# Altium footprint library XU-GENARAL PCB .PcbLib: 1176 footprints (part 39 of 75)
Each footprint in its own frame and in the unit in brackets; x right, y up, seen from the top. Pads: shape width x height; smd on the part's side, far side on the other; paste and mask are expansions set on the pad; w line width, h text height; cw(c..) or ccw(c..) is an arc to the next point about the centre after c.
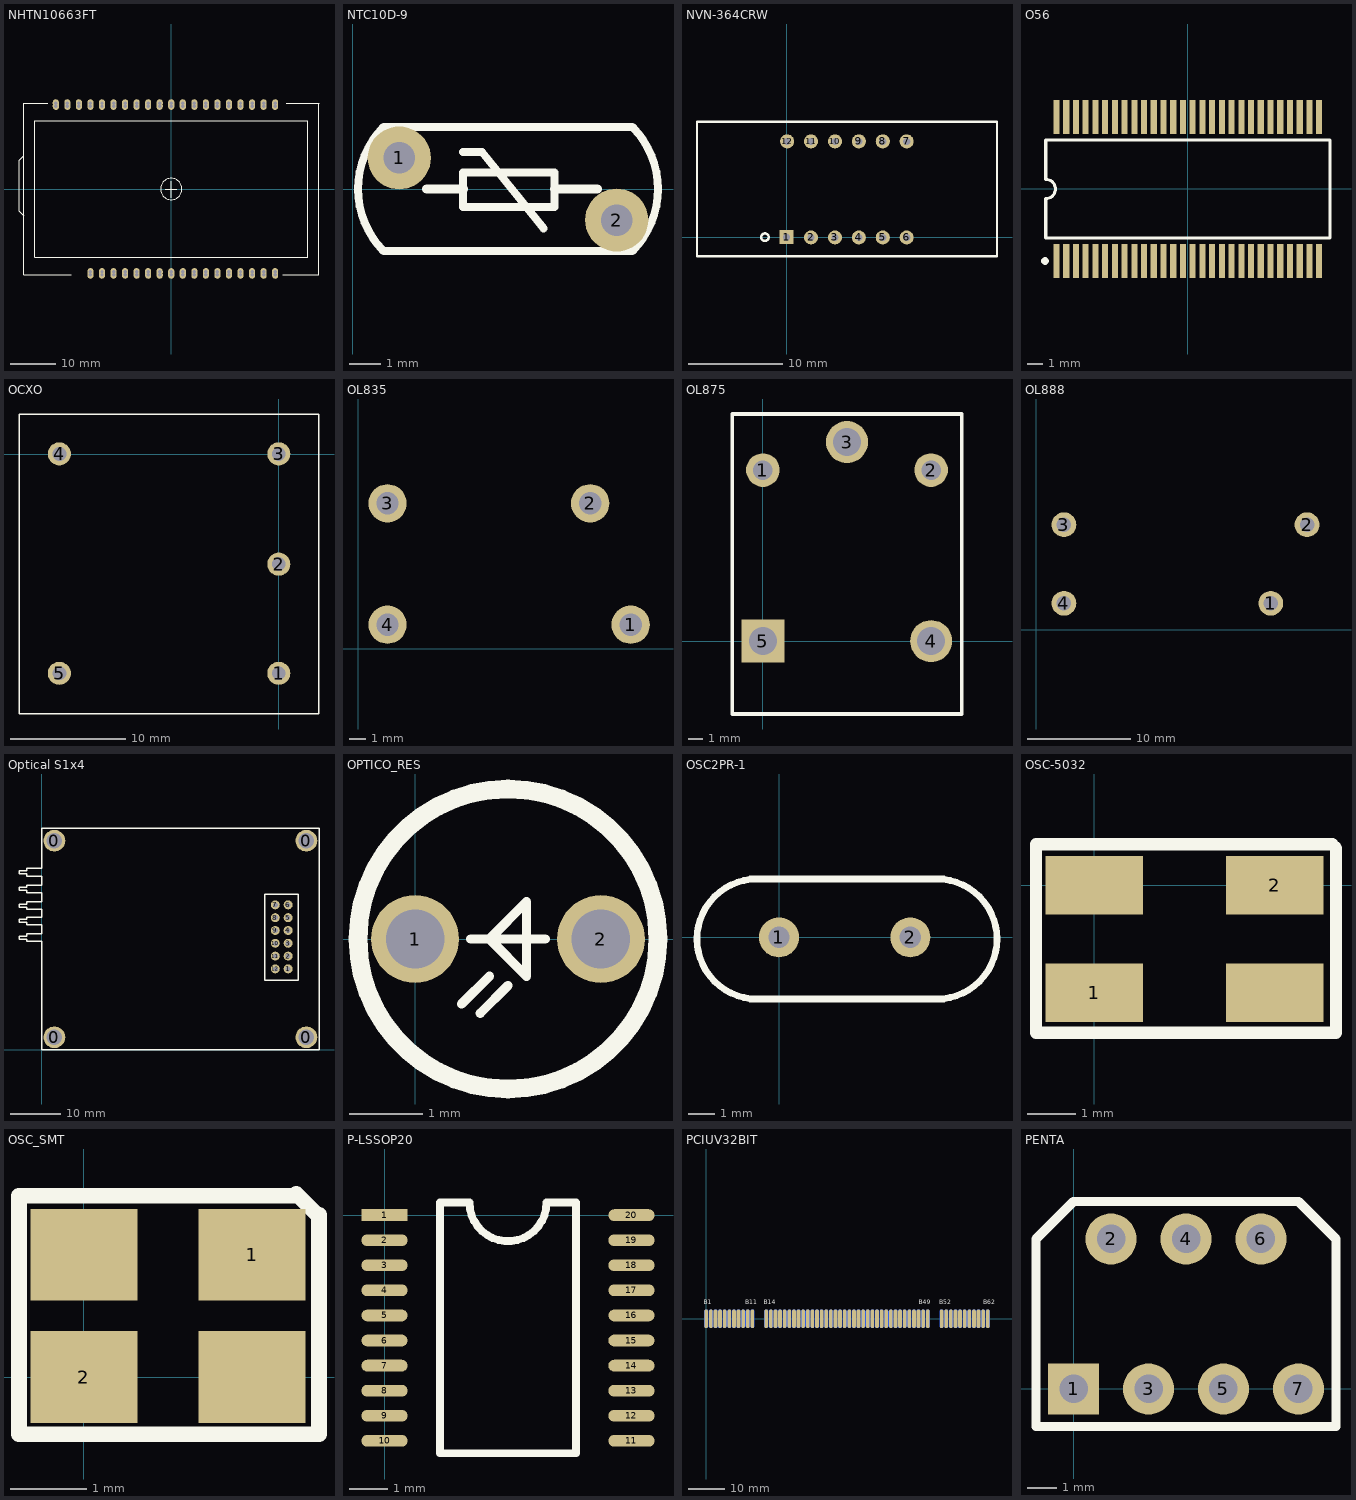
[diagram p38: the footprints below, top view; thin cyan lines are the x and y axes]

## NHTN10663FT [mm]
pads (74):
  oval 1.35x1.7 hole 0.762: 0(-25.4,18.25) 0(-25.4,18.9) 1(-22.86,18.25) 1(-22.86,18.9) 2(-20.32,18.25) 2(-20.32,18.9) 3(-17.78,18.25) 3(-17.78,18.9) 4(-15.24,18.25) 4(-15.24,18.9) 5(-12.7,18.25) 5(-12.7,18.9) 6(-10.16,18.25) 6(-10.16,18.9) 7(-7.62,18.25) 7(-7.62,18.9) 8(-5.08,18.25) 8(-5.08,18.9) 9(-2.54,18.25) 9(-2.54,18.9) 10(0,18.25) 10(0,18.9) 11(2.54,18.25) 11(2.54,18.9) 12(5.08,18.25) 12(5.08,18.9) 13(7.62,18.25) 13(7.62,18.9) 14(10.16,18.25) 14(10.16,18.9) 15(12.7,18.25) 15(12.7,18.9) 16(15.24,18.25) 16(15.24,18.9) 17(17.78,18.25) 17(17.78,18.9) 18(20.32,18.25) 18(20.32,18.9) 19(22.86,18.25) 19(22.86,18.9) 20(22.86,-18.9) 20(22.86,-18.25) 21(20.32,-18.9) 21(20.32,-18.25) 22(17.78,-18.9) 22(17.78,-18.25) 23(15.24,-18.9) 23(15.24,-18.25) 24(12.7,-18.9) 24(12.7,-18.25) 25(10.16,-18.9) 25(10.16,-18.25) 26(7.62,-18.9) 26(7.62,-18.25) 27(5.08,-18.9) 27(5.08,-18.25) 28(2.54,-18.9) 28(2.54,-18.25) 29(0,-18.9) 29(0,-18.25) 30(-2.54,-18.9) 30(-2.54,-18.25) 31(-5.08,-18.9) 31(-5.08,-18.25) 32(-7.62,-18.9) 32(-7.62,-18.25) 33(-10.16,-18.9) 33(-10.16,-18.25) 34(-12.7,-18.9) 34(-12.7,-18.25) 35(-15.24,-18.9) 35(-15.24,-18.25) 36(-17.78,-18.9) 36(-17.78,-18.25)
Top Overlay:
  circle w0.203: c0,0 r2.357
  lines w0.127: -30,-15 -30,15 30,15 30,-15 -30,-15
  lines w0.203: -32.5,-5.888 -33.5,-4.888 -33.5,6.288 -32.5,7.288 ; -27.13,18.9 -32.5,18.9 -32.5,-18.9 -22,-18.9 ; -1.286,0 1.254,0 ; 0,-1.874 0,1.666 ; 24.5,-18.9 32.5,-18.9 32.5,18.9 ; 25.25,18.9 32.51,18.9

## NTC10D-9 [mil]
pads (2):
  round 80 hole 40: 1(59.06,39.37) 2(334.65,-39.37)
Top Overlay:
  lines w10: 140,47 164,47 242,-50 ; 39.37,-78.74 cw(c118.11,0) 39.37,78.74 354.33,78.74 cw(c275.59,0) 354.33,-78.74 39.37,-78.74 ; 140,-23 256,-23 256,21 140,21 140,-23
  lines w12: 94,0 140,0 ; 256,0 310,0

## NVN-364CRW [mm]
pads (12):
  rect 1.5x1.5 hole 0.762: 1(0,0)
  round 1.5 hole 0.762: 2(2.594,-0.025) 3(5.134,-0.025) 4(7.674,-0.025) 5(10.214,-0.025) 6(12.754,-0.025) 7(12.754,10.18) 8(10.214,10.18) 9(7.674,10.18) 10(5.134,10.18) 11(2.594,10.18) 12(0.054,10.18)
Top Overlay:
  circle w0.254: c-2.307,0 r0.402
  lines w0.254: -9.525,-2.032 22.352,-2.032 22.352,12.269 -9.525,12.269 -9.525,-2.032

## O56 [mm] "SSOP; 56 Leads; Body Width 7.5 mm; Pitch 0.635 mm"
height 2.8
pads (56):
  rect 0.4x2.2 smd: 1(-8.572,-4.7) 2(-7.938,-4.7) 3(-7.302,-4.7) 4(-6.667,-4.7) 5(-6.032,-4.7) 6(-5.397,-4.7) 7(-4.763,-4.7) 8(-4.127,-4.7) 9(-3.492,-4.7) 10(-2.857,-4.7) 11(-2.222,-4.7) 12(-1.587,-4.7) 13(-0.953,-4.7) 14(-0.318,-4.7) 15(0.318,-4.7) 16(0.953,-4.7) 17(1.587,-4.7) 18(2.222,-4.7) 19(2.857,-4.7) 20(3.492,-4.7) 21(4.127,-4.7) 22(4.763,-4.7) 23(5.397,-4.7) 24(6.032,-4.7) 25(6.667,-4.7) 26(7.302,-4.7) 27(7.938,-4.7) 28(8.572,-4.7) 29(8.572,4.7) 30(7.938,4.7) 31(7.302,4.7) 32(6.667,4.7) 33(6.032,4.7) 34(5.397,4.7) 35(4.763,4.7) 36(4.127,4.7) 37(3.492,4.7) 38(2.857,4.7) 39(2.222,4.7) 40(1.587,4.7) 41(0.953,4.7) 42(0.318,4.7) 43(-0.318,4.7) 44(-0.953,4.7) 45(-1.587,4.7) 46(-2.222,4.7) 47(-2.857,4.7) 48(-3.492,4.7) 49(-4.127,4.7) 50(-4.763,4.7) 51(-5.397,4.7) 52(-6.032,4.7) 53(-6.667,4.7) 54(-7.302,4.7) 55(-7.938,4.7) 56(-8.572,4.7)
Top Overlay:
  circle w0.25: c-9.323,-4.7 r0.125
  lines w0.2: -9.275,-3.2 9.275,-3.2 9.275,3.2 -9.275,3.2 -9.275,0.635 cw(c-9.275,0) -9.275,-0.635 -9.275,-3.2

## OCXO [mm]
pads (5):
  round 2 hole 1.2: 1(0,-19) 2(0,-9.525) 3(0,0.05) 4(-19.05,0.05) 5(-19.05,-19)
Top Overlay:
  lines w0.127: -22.554,-21.506 -22.554,3.494 ; -22.549,-22.519 -22.549,-21.519 ; -22.514,3.477 2.486,3.477 ; -22.512,-22.517 3.488,-22.517 ; 2.482,3.477 3.482,3.477 ; 3.493,-22.514 3.493,3.486

## OL835 [mm]
pads (4):
  round 2.4 hole 1.4: 1(17.09,1.5) 2(14.55,9.1) 3(1.85,9.1) 4(1.85,1.5)
Bottom Overlay:
  lines w0.254: 18.796,0 18.796,10.6 ; 18.8,0 0,0 0,10.6 18.8,10.6

## OL875 [mm]
pads (5):
  round 2.4 hole 1.4: 1(0,12.2) 2(12,12.2)
  round 3 hole 2: 3(6,14.2) 4(12,0)
  rect 3.048x3.048 hole 2: 5(0,0)
Top Overlay:
  lines w0.254: -2.2,-5.2 -2.2,16.2 14.2,16.2 14.2,-5.2 -2.2,-5.2

## OL888 [mm]
pads (4):
  round 2.4 hole 1.4: 1(22.7,2.55) 2(26.2,10.15) 3(2.7,10.15) 4(2.7,2.55)
Bottom Overlay:
  lines w0.254: 0,0 0,12.7 29,12.7 29,0 0,0

## Optical S1x4 [mil]
height 267.72
pads (16):
  round 170 hole 120: 0(98.42,98.43) 0(98.42,1633.86) 0(2066.93,98.43) 0(2066.93,1633.86)
  round 70 hole 39.37: 1(1924.02,632.64) 2(1924.02,732.64) 3(1924.02,832.64) 4(1924.02,932.64) 5(1924.02,1032.64) 6(1924.02,1132.64) 7(1824.02,1132.64) 8(1824.02,1032.64) 9(1824.02,932.64) 10(1824.02,832.64) 11(1824.02,732.64) 12(1824.02,632.64)
Top Overlay:
  lines w10: 1760,545 2005,545 2005,1215 1740,1215 1740,545 1945,545 ; -178.11,865.32 -118.11,865.32 -118.11,847.24 0,847.24 0,0 2165.35,0 2165.35,1732.28 0,1732.28 0,1417.28 -118.11,1417.28 -118.11,1399.13 -178.11,1399.13 -178.11,1375.36 -118.11,1375.36 -118.11,1357.28 0,1357.28 0,1287.28 -118.11,1287.28 -118.11,1269.13 -178.11,1269.13 -178.11,1245.36 -118.11,1245.36 -118.11,1240.84 -118.11,1238.58 -118.11,1234.06 -118.11,1231.8 -118.11,1227.28 0,1227.28 0,1157.28 -118.11,1157.28 -118.11,1139.13 -178.11,1139.13 -178.11,1115.36 -118.11,1115.36 -118.11,1097.28 0,1097.28 0,1037.28 -118.11,1037.28 -118.11,1019.13 -178.11,1019.13 -178.11,995.36 -118.11,995.36 -118.11,977.28 0,977.28 0,907.24 -118.11,907.24 -118.11,889.1 -178.11,889.1 -178.11,865.32

## OPTICO_RES [mm]
pads (2):
  round 1.2 hole 0.8: 1(0,0) 2(2.54,0)
Top Overlay:
  circle w0.254: c1.27,0 r2.05
  lines w0.127: 0.635,-0.889 1.016,-0.508 ; 0.762,0 1.778,0 ; 0.889,-1.016 1.27,-0.635 ; 1.016,0 1.524,-0.508 1.524,0.508 1.016,0

## OSC2PR-1 [mil]
height 183.07
pads (2):
  round 60 hole 32: 1(-0.55,0.16) 2(196.45,0.16)
Top Overlay:
  lines w10: -43.55,-92.34 246.45,-92.34 ; -43.55,87.66 246.45,87.66 ; -33.55,-92.33 cw(c-33.55,-2.33) -33.55,87.67 ; 236.45,-92.33 ccw(c236.45,-2.33) 236.45,87.67

## OSC-5032 [mm]
pads (4):
  rect 2x1.2 smd: 1(0,-2.2) 2(3.7,0) ""(0,0) ""(3.7,-2.2)
Top Overlay:
  lines w0.254: -1.194,0.813 -1.194,-3.023 4.953,-3.023 4.953,0.762 4.877,0.838 -1.194,0.838

## OSC_SMT [mm]
pads (4):
  rect 1.4x1.2 smd: 1(2.2,1.6) 2(0,0) ""(0,1.6) ""(2.2,0)
Top Overlay:
  lines w0.203: 2.774,2.374 -0.85,2.374 -0.85,-0.75 3.074,-0.75 ; 2.774,2.399 3.074,2.099 ; 3.074,-0.7 3.074,2.124

## P-LSSOP20 [mm]
pads (20):
  rect 1.2x0.305 smd: 1(0,0)
  oval 1.2x0.305 smd: 2(0,-0.65) 3(0,-1.3) 4(0,-1.95) 5(0,-2.6) 6(0,-3.25) 7(0,-3.9) 8(0,-4.55) 9(0,-5.2) 10(0,-5.85) 11(6.4,-5.85) 12(6.4,-5.2) 13(6.4,-4.55) 14(6.4,-3.9) 15(6.4,-3.25) 16(6.4,-2.6) 17(6.4,-1.95) 18(6.4,-1.3) 19(6.4,-0.65) 20(6.4,0)
Top Overlay:
  lines w0.2: 1.435,-6.175 1.435,0.325 2.2,0.325 ccw(c3.2,0.325) 4.2,0.325 4.965,0.325 4.965,-6.175 1.435,-6.175

## PCIUV32BIT [mil]
pads (116):
  oval 40x200 smd far side: A1(0,0) A2(50,0) A3(100,0) A4(150,0) A5(200,0) A6(250,0) A7(300,0) A8(350,0) A9(400,0) A10(450,0) A11(500,0) A14(650,0) A15(700,0) A16(750,0) A17(800,0) A18(850,0) A19(900,0) A20(950,0) A21(1000,0) A22(1050,0) A23(1100,0) A24(1150,0) A25(1200,0) A26(1250,0) A27(1300,0) A28(1350,0) A29(1400,0) A30(1450,0) A31(1500,0) A32(1550,0) A33(1600,0) A34(1650,0) A35(1700,0) A36(1750,0) A37(1800,0) A38(1850,0) A39(1900,0) A40(1950,0) A41(2000,0) A42(2050,0) A43(2100,0) A44(2150,0) A45(2200,0) A46(2250,0) A47(2300,0) A48(2350,0) A49(2400,0) A52(2550,0) A53(2600,0) A54(2650,0) A55(2700,0) A56(2750,0) A57(2800,0) A58(2850,0) A59(2900,0) A60(2950,0) A61(3000,0) A62(3050,0)
  oval 40x200 smd: B1(0,0) B2(50,0) B3(100,0) B4(150,0) B5(200,0) B6(250,0) B7(300,0) B8(350,0) B9(400,0) B10(450,0) B11(500,0) B14(650,0) B15(700,0) B16(750,0) B17(800,0) B18(850,0) B19(900,0) B20(950,0) B21(1000,0) B22(1050,0) B23(1100,0) B24(1150,0) B25(1200,0) B26(1250,0) B27(1300,0) B28(1350,0) B29(1400,0) B30(1450,0) B31(1500,0) B32(1550,0) B33(1600,0) B34(1650,0) B35(1700,0) B36(1750,0) B37(1800,0) B38(1850,0) B39(1900,0) B40(1950,0) B41(2000,0) B42(2050,0) B43(2100,0) B44(2150,0) B45(2200,0) B46(2250,0) B47(2300,0) B48(2350,0) B49(2400,0) B52(2550,0) B53(2600,0) B54(2650,0) B55(2700,0) B56(2750,0) B57(2800,0) B58(2850,0) B59(2900,0) B60(2950,0) B61(3000,0) B62(3050,0)
Top Overlay:
  text "B1" at -25,155 h48
  text "B11" at 425,155 h48
  text "B49" at 2300,155 h48
  text "B62" at 3000,155 h48
  text "B52" at 2525,155 h48
  text "B14" at 625,155 h48
Bottom Overlay:
  text "A62" at 3125,155 h48
  text "A52" at 2650,155 h48
  text "A14" at 725,155 h48
  text "A1" at 25,155 h48
  text "A11" at 525,155 h48
  text "A49" at 2425,155 h48

## PENTA [mil]
pads (7):
  rect 68x68 hole 38: 1(0,0)
  round 68 hole 38: 2(50,200) 3(100,0) 4(150,200) 5(200,0) 6(250,200) 7(300,0)
Top Overlay:
  lines w12: -50,-50 350,-50 350,200 300,250 0,250 -50,200 -50,-50